# Altium footprint library MainLibrary.PcbLib: 85 footprints (part 1 of 6)
Each footprint in its own frame and in the unit in brackets; x right, y up, seen from the top. Pads: shape width x height; smd on the part's side, far side on the other; paste and mask are expansions set on the pad; w line width, h text height; cw(c..) or ccw(c..) is an arc to the next point about the centre after c.
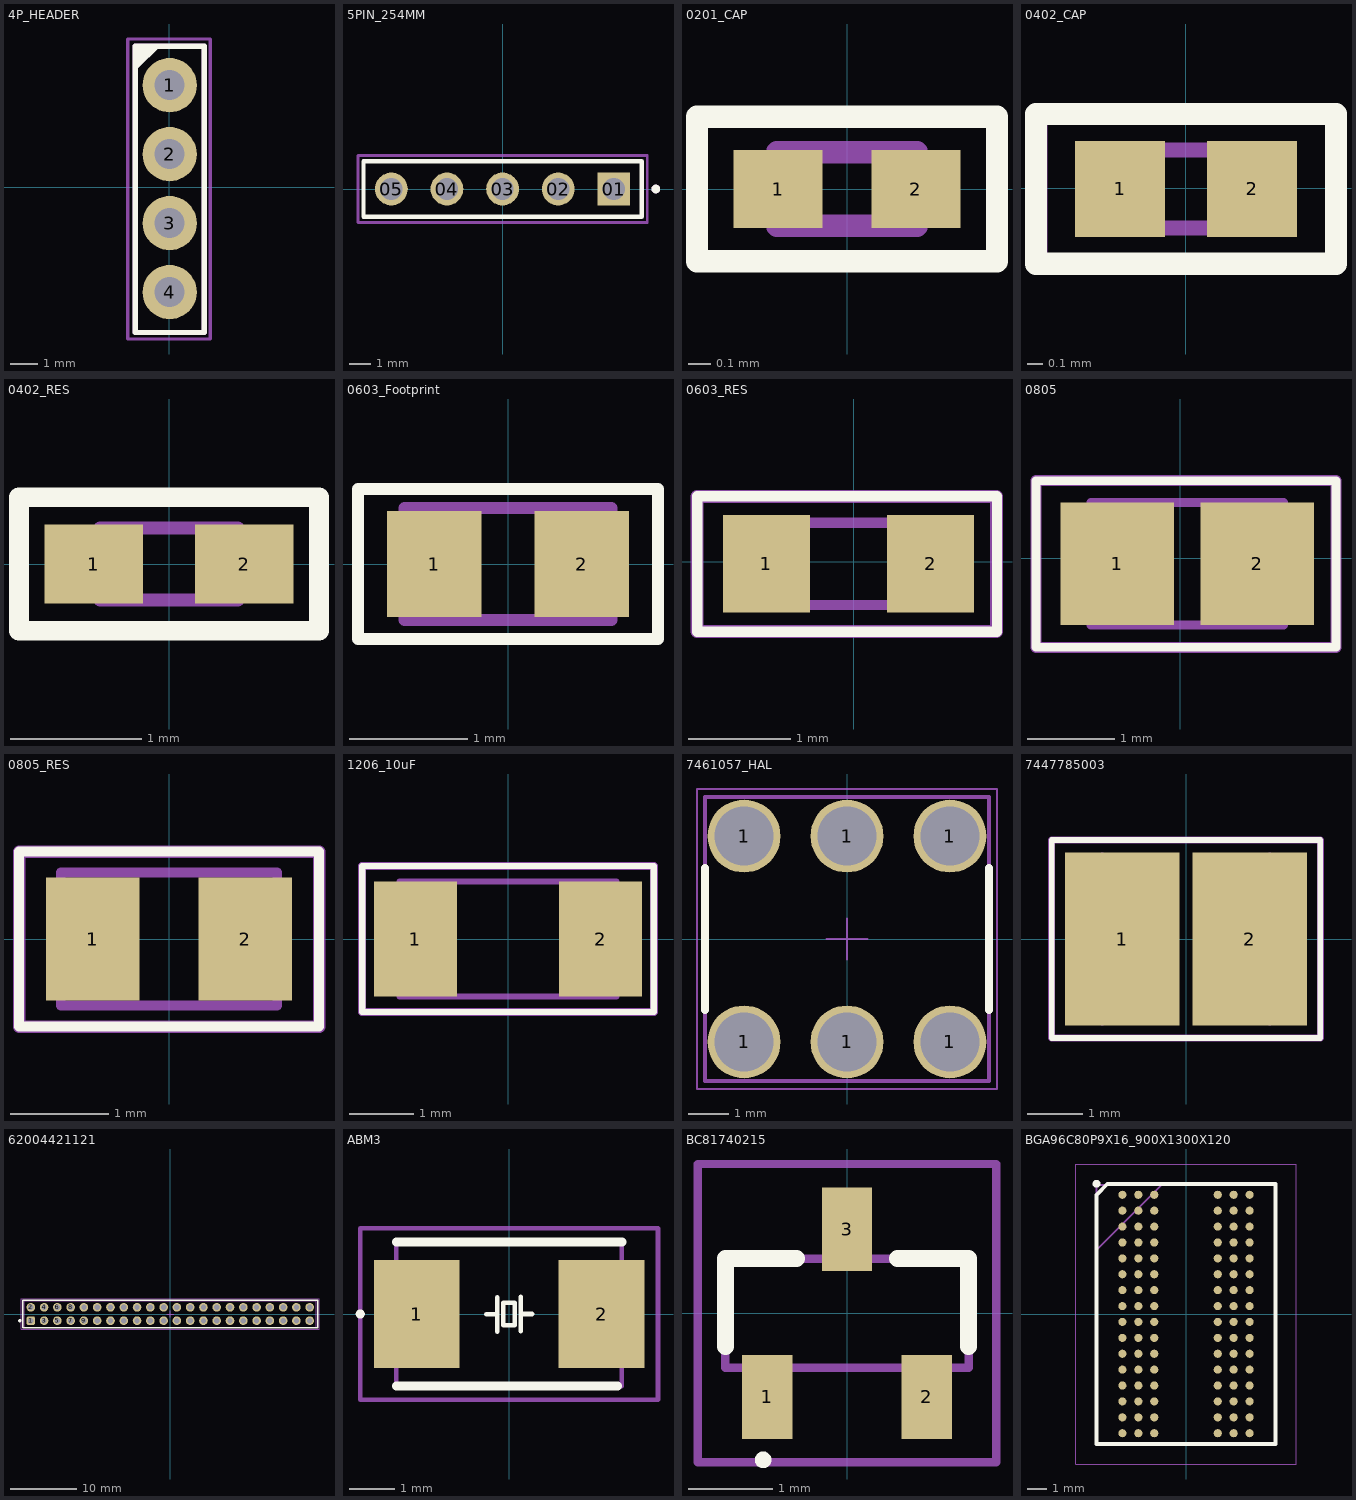
[diagram p0: the footprints below, top view; thin cyan lines are the x and y axes]

## 4P_HEADER [mm]
pads (4):
  round 2 hole 1.1: 1(0.025,3.761) 2(0.025,1.221) 3(0.025,-1.319) 4(0.025,-3.859)
Top Overlay:
  region: -1.205,5.221 -1.205,4.321 -0.305,5.221
  lines w0.2: -1.245,-5.349 -1.245,5.191 1.295,5.191 1.295,-5.349 -1.245,-5.349
Top Assembly:
  lines w0.2: -1.245,-5.349 -1.245,5.191 1.295,5.191 1.295,-5.349 -1.245,-5.349
Mechanical 15:
  lines w0.127: -1.524,-5.588 1.524,-5.588 1.524,5.461 -1.524,5.461 -1.524,-5.588
3D body "M20-7820442.step": height 8.5, standoff -3, extent -1.225,-5.329 1.275,5.231

## 5PIN_254MM [mm]
pads (5):
  rect 1.5x1.5 hole 1.02: 01(5.08,0)
  round 1.5 hole 1.02: 02(2.54,0) 03(0,0) 04(-2.54,0) 05(-5.08,0)
Top Overlay:
  circle w0.2: c7,0 r0.1
  lines w0.2: -6.35,-1.27 6.35,-1.27 6.35,1.27 -6.35,1.27 -6.35,-1.27
Mechanical 13:
  circle w0.2: c7,0 r0.1
  lines w0.1: -6.35,-1.27 -6.35,1.27 ; -6.35,-1.27 6.35,-1.27 ; -6.35,-1.27 -6.35,1.27 ; -6.35,1.27 6.35,1.27 ; -6.35,1.27 6.35,1.27 ; 6.35,-1.27 6.35,1.27 ; 6.35,-1.27 6.35,1.27
Mechanical 15:
  lines w0.127: -6.604,-1.524 6.604,-1.524 6.604,1.524 -6.604,1.524 -6.604,-1.524

## 0201_CAP [mm]
pads (2):
  rect 0.4x0.35 smd: 1(-0.31,0) 2(0.31,0)
Top Overlay:
  lines w0.1: -0.675,-0.325 0.675,-0.325 0.675,-0.125 0.675,0.325 -0.675,0.325 -0.675,-0.125 -0.675,-0.325
Mechanical 13:
  lines w0.1: -0.315,-0.165 -0.315,0.165 0.315,0.165 0.315,-0.165 -0.315,-0.165
3D body "CAP 0201.STEP": height 0.3, standoff 0, extent -0.3,-0.15 0.3,0.15

## 0402_CAP [mm]
pads (2):
  rect 0.6x0.64 smd: 1(-0.44,-0.005) 2(0.44,-0.005)
Top Overlay:
  lines w0.15: -1,-0.505 -1,0.295 -1,0.495 1,0.495 1,-0.305 1,-0.505 -1,-0.505
Mechanical 13:
  lines w0.1: -0.515,-0.265 0.515,-0.265 0.515,0.255 -0.515,0.255 -0.515,-0.265
Mechanical 15:
  lines w0.05: -0.95,-0.505 0.95,-0.505 0.95,0.495 -0.95,0.495 -0.95,-0.505
3D body "0402 cap.STEP": height 0.52, standoff 0, extent -0.5,-0.267 0.5,0.257

## 0402_RES [mm]
pads (2):
  rect 0.75x0.6 smd: 1(-0.575,0) 2(0.575,0)
Top Overlay:
  lines w0.15: -1.143,-0.508 1.143,-0.508 1.143,-0.381 1.143,0.508 -1.143,0.508 -1.143,-0.381 -1.143,-0.508
Mechanical 13:
  lines w0.1: -0.525,-0.275 0.525,-0.275 0.525,0.275 -0.525,0.275 -0.525,-0.275
3D body "0402 resistor.STEP": height 0.35, standoff 0, extent -0.5,-0.25 0.5,0.25

## 0603_Footprint [mm]
pads (2):
  rect 0.8x0.9 smd: 1(-0.625,0) 2(0.625,0)
Top Overlay:
  lines w0.1: -1.27,-0.635 1.27,-0.635 1.27,0.635 -1.27,0.635 -1.27,-0.635
Mechanical 13:
  lines w0.1: -0.875,-0.475 -0.875,0.475 0.875,0.475 0.875,-0.475 -0.875,-0.475
3D body "0603 cap.STEP": height 0.82, standoff 0, extent -0.8,-0.412 0.8,0.412

## 0603_RES [mm]
pads (2):
  rect 0.85x0.95 smd: 1(-0.85,-0.023) 2(0.75,-0.023)
Top Overlay:
  lines w0.1: -1.524,-0.684 1.397,-0.684 1.397,0.635 -1.524,0.635 -1.524,-0.684
Mechanical 13:
  lines w0.1: -0.85,-0.423 -0.85,0.377 0.75,0.377 0.75,-0.423 -0.85,-0.423
Mechanical 15:
  lines w0.127: -1.527,-0.682 1.394,-0.682 1.394,0.635 -1.527,0.635 -1.527,-0.682
3D body "0603 resistor.STEP": height 0.45, standoff 0, extent -0.8,-0.4 0.8,0.4

## 0805 [mm]
pads (2):
  rect 1.3x1.4 smd: 1(-0.721,-0.06) 2(0.879,-0.06)
Top Overlay:
  lines w0.1: -1.651,-1.016 1.778,-1.016 1.778,0.889 -1.651,0.889 -1.651,-1.016
Mechanical 13:
  lines w0.1: -1.021,-0.76 1.179,-0.76 1.179,0.64 -1.021,0.64 -1.021,-0.76
Mechanical 15:
  lines w0.127: -1.651,-1.016 1.778,-1.016 1.778,0.889 -1.651,0.889 -1.651,-1.016
3D body "0805 cap.STEP": height 1.26, standoff -0.02, extent -0.921,-0.697 1.079,0.577

## 0805_RES [mm]
pads (2):
  rect 0.95x1.25 smd: 1(-0.775,0) 2(0.775,0)
Top Overlay:
  lines w0.1: -1.524,-0.889 -1.524,0.889 1.524,0.889 1.524,-0.889 -1.524,-0.889
Mechanical 13:
  lines w0.1: -1.1,-0.675 1.1,-0.675 1.1,0.675 -1.1,0.675 -1.1,-0.675
Mechanical 15:
  lines w0.127: -1.524,-0.889 1.524,-0.889 1.524,0.889 -1.524,0.889 -1.524,-0.889
3D body "0805 resistor.STEP": height 0.6, standoff 0, extent -1,-0.625 1,0.625

## 1206_10uF [mm]
pads (2):
  rect 1.3x1.8 smd: 1(-1.45,0) 2(1.45,0)
Top Overlay:
  lines w0.1: -2.286,-1.143 2.286,-1.143 2.286,1.143 -2.286,1.143 -2.286,-1.143
Mechanical 13:
  lines w0.1: -1.7,-0.9 1.7,-0.9 1.7,0.9 -1.7,0.9 -1.7,-0.9
Mechanical 15:
  lines w0.127: -2.286,-1.143 2.286,-1.143 2.286,1.143 -2.286,1.143 -2.286,-1.143
3D body "CAP 1206-0.8mm.STEP": height 0.8, standoff 0, extent -1.6,-0.8 1.6,0.8

## 7461057_HAL [mm] "WP-BUTR Bushes with two Rows Pin-Plate, M3, blind thr 6mm"
height 6
pads (6):
  round 1.8 hole 1.45: 1(-2.54,-2.54) 1(-2.54,2.54) 1(0,-2.54) 1(0,2.54) 1(2.54,-2.54) 1(2.54,2.54)
Top Overlay:
  lines w0.2: -3.5,-1.75 -3.5,1.75 ; 3.5,-1.75 3.5,1.75
Top 3D Body:
  lines w0.1: -3.5,-3.5 3.5,-3.5 3.5,3.5 -3.5,3.5 -3.5,-3.5
Top Courtyard:
  lines w0.05: -0.5,0 0.5,0 ; 0,-0.5 0,0.5 ; -3.7,-3.7 -3.7,3.7 3.7,3.7 3.7,-3.7 -3.7,-3.7
Top Component Outline:
  lines w0.1: -3.5,-3.5 -3.5,3.5 3.5,3.5 3.5,-3.5 -3.5,-3.5
3D body "7461057.stp": height 6, standoff -3.5, extent -3.5,-3.5 3.5,3.5

## 7447785003 [mm]
pads (2):
  rect 2.05x3.1 smd: 1(-1.143,0) 2(1.143,0)
Top Overlay:
  lines w0.1: -2.413,-1.778 -2.413,1.778 2.413,1.778 2.413,-1.778 -2.413,-1.778
Mechanical 13:
  lines w0.1: -1.5,-1.5 -1.5,1.5 ; 1.5,-1.5 1.5,1.5
Mechanical 15:
  lines w0.127: -2.413,-1.778 2.413,-1.778 2.413,1.778 -2.413,1.778 -2.413,-1.778
3D body "74438336033.stp": height 2, standoff 0, extent -1.5,-1.5 1.5,1.5

## 62004421121 [mm] "2.00 mm THT Dual Pin Header, 44p"
height 6
pads (44):
  rrect50% 1.3x1.3 hole 0.8: 1(-21,-1)
  round 1.3 hole 0.8: 2(-21,1) 3(-19,-1) 4(-19,1) 5(-17,-1) 6(-17,1) 7(-15,-1) 8(-15,1) 9(-13,-1) 10(-13,1) 11(-11,-1) 12(-11,1) 13(-9,-1) 14(-9,1) 15(-7,-1) 16(-7,1) 17(-5,-1) 18(-5,1) 19(-3,-1) 20(-3,1) 21(-1,-1) 22(-1,1) 23(1,-1) 24(1,1) 25(3,-1) 26(3,1) 27(5,-1) 28(5,1) 29(7,-1) 30(7,1) 31(9,-1) 32(9,1) 33(11,-1) 34(11,1) 35(13,-1) 36(13,1) 37(15,-1) 38(15,1) 39(17,-1) 40(17,1) 41(19,-1) 42(19,1) 43(21,-1) 44(21,1)
Top Overlay:
  circle w0.25: c-22.65,-1 r0.125
  lines w0.2: -22.2,-2.075 -22.2,2.075 22.2,2.075 22.2,-2.075 -22.2,-2.075
Top Courtyard:
  lines w0.05: -22.4,-2.275 22.4,-2.275 22.4,2.275 -22.4,2.275 -22.4,-2.275
Top Component Outline:
  lines w0.1: -22,-2 -22,2 22,2 22,-2 -22,-2
Top Component Center:
  lines w0.05: -0.5,0 0.5,0 ; 0,-0.5 0,0.5
3D body "62004421121.stp": height 6.05, standoff -2.65, extent -22,-2 22,2

## ABM3 [mm]
pads (2):
  rect 1.9x2.4 smd: 1(-2.05,0) 2(2.05,0)
Top Overlay:
  lines w0.1: -0.513,-0.008 -0.259,-0.008 ; -0.259,-0.389 -0.259,0.373 ; 0.254,-0.381 0.254,0.381 ; 0.254,0 0.508,0 ; -3.352,0 cw(c-3.302,0) -3.252,0 cw(c-3.302,0) -3.352,0 ; -0.127,-0.254 -0.127,0.254 0.127,0.254 0.127,-0.254 -0.127,-0.254
  lines w0.2: -2.5,-1.6 2.4,-1.6 ; -2.5,1.6 2.5,1.6
Mechanical 13:
  lines w0.1: -2.5,-1.6 -2.5,1.6 2.5,1.6 2.5,-1.6 -2.5,-1.6
Mechanical 15:
  lines w0.1: -3.302,-1.905 -3.302,1.905 3.302,1.905 3.302,-1.905 -3.302,-1.905
3D body "ABM3-8.000MHZ-D2Y-T.stp": height 1.3, standoff 0, extent -2.5,-1.6 2.5,1.6

## BC81740215 [mm]
pads (3):
  rect 0.6x1 smd: 1(-0.95,-1) 2(0.95,-1) 3(0,1)
Top Overlay:
  lines w0.1: -1,-1.8 ccw(c-1,-1.75) -1,-1.7 ccw(c-1,-1.75) -1,-1.8
  lines w0.2: -1.45,-0.4 -1.45,0.65 -0.6,0.65 ; 0.6,0.65 1.45,0.65 1.45,-0.4
Mechanical 13:
  lines w0.1: -1.45,-0.65 1.45,-0.65 1.45,0.65 -1.45,0.65 -1.45,-0.65
Mechanical 15:
  lines w0.1: -1.778,-1.778 1.778,-1.778 1.778,1.778 -1.778,1.778 -1.778,-1.778
3D body "ALSRobot-SOT23.STEP": height 1.08, standoff 0, extent -1.5,-1.32 1.5,1.32

## BGA96C80P9X16_900X1300X120 [mm]
pads (96):
  round 0.41 smd: A1(-3.2,6) A2(-2.4,6) A3(-1.6,6) A7(1.6,6) A8(2.4,6) A9(3.2,6) B1(-3.2,5.2) B2(-2.4,5.2) B3(-1.6,5.2) B7(1.6,5.2) B8(2.4,5.2) B9(3.2,5.2) C1(-3.2,4.4) C2(-2.4,4.4) C3(-1.6,4.4) C7(1.6,4.4) C8(2.4,4.4) C9(3.2,4.4) D1(-3.2,3.6) D2(-2.4,3.6) D3(-1.6,3.6) D7(1.6,3.6) D8(2.4,3.6) D9(3.2,3.6) E1(-3.2,2.8) E2(-2.4,2.8) E3(-1.6,2.8) E7(1.6,2.8) E8(2.4,2.8) E9(3.2,2.8) F1(-3.2,2) F2(-2.4,2) F3(-1.6,2) F7(1.6,2) F8(2.4,2) F9(3.2,2) G1(-3.2,1.2) G2(-2.4,1.2) G3(-1.6,1.2) G7(1.6,1.2) G8(2.4,1.2) G9(3.2,1.2) H1(-3.2,0.4) H2(-2.4,0.4) H3(-1.6,0.4) H7(1.6,0.4) H8(2.4,0.4) H9(3.2,0.4) J1(-3.2,-0.4) J2(-2.4,-0.4) J3(-1.6,-0.4) J7(1.6,-0.4) J8(2.4,-0.4) J9(3.2,-0.4) K1(-3.2,-1.2) K2(-2.4,-1.2) K3(-1.6,-1.2) K7(1.6,-1.2) K8(2.4,-1.2) K9(3.2,-1.2) L1(-3.2,-2) L2(-2.4,-2) L3(-1.6,-2) L7(1.6,-2) L8(2.4,-2) L9(3.2,-2) M1(-3.2,-2.8) M2(-2.4,-2.8) M3(-1.6,-2.8) M7(1.6,-2.8) M8(2.4,-2.8) M9(3.2,-2.8) N1(-3.2,-3.6) N2(-2.4,-3.6) N3(-1.6,-3.6) N7(1.6,-3.6) N8(2.4,-3.6) N9(3.2,-3.6) P1(-3.2,-4.4) P2(-2.4,-4.4) P3(-1.6,-4.4) P7(1.6,-4.4) P8(2.4,-4.4) P9(3.2,-4.4) R1(-3.2,-5.2) R2(-2.4,-5.2) R3(-1.6,-5.2) R7(1.6,-5.2) R8(2.4,-5.2) R9(3.2,-5.2) T1(-3.2,-6) T2(-2.4,-6) T3(-1.6,-6) T7(1.6,-6) T8(2.4,-6) T9(3.2,-6)
Top Overlay:
  circle w0.2: c-4.5,6.555 r0.1
  lines w0.2: -4.5,-6.555 4.5,-6.555 4.5,6.555 -3.945,6.555 -4.5,6 -4.5,-6.555
Mechanical 13:
  lines w0.1: -4.5,3.225 -1.225,6.5 ; -4.5,-6.5 4.5,-6.5 4.5,6.5 -4.5,6.5 -4.5,-6.5
Mechanical 15:
  lines w0.05: -5.55,-7.55 5.55,-7.55 5.55,7.55 -5.55,7.55 -5.55,-7.55
3D body "IS43TR16640C-125JBLI.stp": height 1.2, standoff 0, extent -4.5,-6.5 4.5,6.5